# Altium schematic symbol library AD_Lib.SchLib: 1239 symbols (part 8 of 9) (continued)
## RN0603_2.2K*4
designator RN?, comment 2.2k¦¸,62.5mW
ÌùÆ¬ÅÅ×è; Manufacturer: KOA; pro-environment: RoHS; Quality: -55~125¡æ; other: 2.2k¦¸,62.5mW,5%,50V; OPN: CN1J4TTD222J; PadsNum: 0; SN: SN; Category: ÅÅ×è; Part: CN1J4TTD222J; Value: 2.2k¦¸,62.5mW; Price: ?; OPN_JLC: OPN_JLC; SN_JLC: SN_JLC; Price_JLC: 0
footprint RN0603*4
pins: 1, 2, 3, 4, 5, 6, 7, 8

## RN0603_10K*4
designator RN?, comment 10k¦¸,62.5mW
ÌùÆ¬ÅÅ×è; Manufacturer: KOA; pro-environment: RoHS; Quality: -55~125¡æ; SN: 03.4.38.13.16010301S; other: 10Kk¦¸,62.5mW,5%,50V; OPN: CN1J4TTD103J; PadsNum: 0; Category: ÅÅ×è; Part: CN1J4TTD103J; Value: 10k¦¸,62.5mW; QTY: 5000; Price: ?; OPN_JLC: OPN_JLC; SN_JLC: SN_JLC; Price_JLC: 0
footprint RN0603*4
pins: 1, 2, 3, 4, 5, 6, 7, 8

## RN0603_10K*4@2
designator RN?, comment 10k¦¸,62.5mW
ÌùÆ¬ÅÅ×è; Manufacturer: Panasonic; pro-environment: RoHS; Quality: -55~155¡æ; other: 10k¦¸,62.5mW,5%,50V; OPN: EXB-38V103JV; PadsNum: 0; SN: SN; Category: ÅÅ×è; Part: EXB-38V103JV; Value: 10k¦¸,62.5mW; Price: ?; OPN_JLC: OPN_JLC; SN_JLC: SN_JLC; Price_JLC: 0
footprint RN0603*4
pins: 1, 2, 3, 4, 5, 6, 7, 8

## RN0603_22*4
designator RN?, comment 22¦¸,62.5mW
ÌùÆ¬ÅÅ×è; Manufacturer: KOA; pro-environment: RoHS; Quality: -55~155¡æ; other: 22¦¸,62.5mW,5%,50V; OPN: CN1J4TTD220J; PadsNum: 0; SN: SN; Category: ÅÅ×è; Part: CN1J4TTD220J; Value: 22¦¸,62.5mW; Price: ?; OPN_JLC: OPN_JLC; SN_JLC: SN_JLC; Price_JLC: 0
footprint RN0603*4
pins: 1, 2, 3, 4, 5, 6, 7, 8

## RV_390KD07
designator RV?, comment 390KD07
Ñ¹Ãôµç×è; 31VDC; 39VDC; 77V; 2.1J; Manufacturer: Ì¨Íå¾ýÒ«; pro-environment: RoHS; Quality: -40~85¡æ; Value: 31VDC,77V,2.1J; other: 31VDC;39VDC;Vc=77V;250A;2.1J; PadsNum: 0; SN: SN; OPN: -; Part: 390KD07; Category: Ñ¹Ãôµç×è; QTY: 1000; Price: -; OPN_JLC: 390KD07; SN_JLC: C78335; Price_JLC: 0.191406
footprint VDR_390K (Footprint not found)
pins: 1, 2

## RV_B72210S0300K101
designator RV?, comment S10K30  (value not drawn)
Ñ¹Ãôµç×è; 30VAC; 38VDC; 93V; 4.4J; Manufacturer: EPCOS; pro-environment: RoHS; Quality: -40~85¡æ; SN: 03.4.38.16.99030001S; Value: 30VAC,93V,4.4J; OPN: B72210S0300K101; other: 30VAC;38VDC;Vc=93V;500A;4.4J; PadsNum: 0; Part: S10K30; Category: Ñ¹Ãôµç×è; QTY: 500; Price: 1.3455; OPN_JLC: OPN_JLC; SN_JLC: SN_JLC; Price_JLC: 0
footprint VDR_S10K30 (Footprint not found)
pins: 1, 2

## RV_B72214S0111K101
designator RV?, comment S14K115
Ñ¹Ãôµç×è; 125VAC; 150VDC; 300V; 30J; Manufacturer: EPCOS; pro-environment: RoHS; Quality: -40~85¡æ; Value: 125VAC,300V,30J; OPN: B72214S0111K101; other: 125VAC;150VDC;300V;4.5kA;30J; PadsNum: 0; SN: SN; Part: S14K115; Category: Ñ¹Ãôµç×è; QTY: 500; Price: 1.7667; OPN_JLC: B72214S0111K101; SN_JLC: C125531; Price_JLC: 0.92916
footprint VDR_S14K115 (EPCOS£¬Ö±²åÑ¹Ãôµç×è)
pins: 1, 2

## RV_B72214S0131K101
designator RV?, comment S14K130  (value not drawn)
Ñ¹Ãôµç×è,130VAC,170VDC,340V,34J; Manufacturer: EPCOS; pro-environment: RoHS; Quality: -40~85¡æ; SN: 03.4.38.14.99013101S; Value: 130VAC,170VDC,34J; OPN: B72214S0131K101; other: 130VAC;170VDC;Vc=340V;4.5kA;34J; PadsNum: 0; Part: S14K130; Category: Ñ¹Ãôµç×è; QTY: 500; Price: 1.7667; OPN_JLC: OPN_JLC; SN_JLC: SN_JLC; Price_JLC: 0
footprint VDR_S14K130 (Footprint not found)
pins: 1, 2

## RV_B72214S0300K101
designator RV?, comment S14K30  (value not drawn)
Ñ¹Ãôµç×è; 30VAC; 38VDC; 93V; 9J; Manufacturer: EPCOS; pro-environment: RoHS; Quality: -40~85¡æ; SN: 03.4.38.14.99030001S; Value: 30VAC,93V; OPN: B72214S0300K101; other: 30VAC;38VDC;Vc=93V;1kA;9J; PadsNum: 0; Part: S14K30; Category: Ñ¹Ãôµç×è; QTY: 500; Price: 1.7667; OPN_JLC: OPN_JLC; SN_JLC: SN_JLC; Price_JLC: 0
footprint VDR_S14K30 (EPCOS£¬Ö±²åÑ¹Ãôµç×è)
pins: 1, 2

## RV_B72214S2271K101
designator RV?, comment S14K275E2  (value not drawn)
Ñ¹Ãôµç×è,275VAC,350VDC,110J; Manufacturer: EPCOS; pro-environment: RoHS; Quality: -40~105¡æ; Value: 275VAC,350VDC,430V,110J; OPN: B72214S2271K101; other: 275VAC;350VDC;Vc=430V;1kA;110J; PadsNum: 0; SN: SN; Part: S14K275E2; Category: Ñ¹Ãôµç×è; QTY: 500; Price: 2.3166; OPN_JLC: OPN_JLC; SN_JLC: SN_JLC; Price_JLC: 0
footprint VDR_S14K275 (Footprint not found)
pins: 1, 2

## RV_ERZVF2M201
designator RV?, comment ERZVF2M201  (value not drawn)
Ñ¹Ãôµç×è,130VAC,170VDC,340V,600A,8J; Manufacturer: Panasonic; pro-environment: RoHS; Quality: -40~85¡æ; Value: 130VAC,170DCV,340V,8J; PadsNum: 0; SN: SN; OPN: ERZVF2M201; Part: ERZVF2M201; Category: Ñ¹Ãôµç×è; QTY: 2000; Price: 5.9202; OPN_JLC: OPN_JLC; SN_JLC: SN_JLC; Price_JLC: 0
footprint ZNR_VF (Footprint not found)
pins: 1, 2

## RV_V30MLA0603NHAUTO
designator RV?, comment V30MLA0603NHAUTO  (value not drawn)
Ñ¹Ãôµç×è; 25V; 74V; 0.1J; Manufacturer: Littelfuse; pro-environment: RoHS; Quality: -40~85¡æ; SN: 03.4.38.16.16V30M01S; Value: 25V,74V,0.1J; other: 25VAC;30VDC;74V;30A;0.1J; PadsNum: 0; OPN: V30MLA0603NHAUTO; Part: V30MLA0603NHAUTO; Category: Ñ¹Ãôµç×è; QTY: 2500; Price: 1.3806; OPN_JLC: OPN_JLC; SN_JLC: SN_JLC; Price_JLC: 0
footprint R0603 (ÌùÆ¬µç×è£¬¹¦ÂÊ1/10W)
pins: 1, 2

## RV_ZV35K14B1
designator RV?, comment ZV35K14  (value not drawn)
Ñ¹Ãôµç×è; Manufacturer: KEKO; pro-environment: RoHS; Quality: -40~85¡æ; Value: 35V,90V,9.2J; OPN: ZV35K14B1; other: Âò²»µ½www.keko-varicon.si; PadsNum: 0; SN: SN; Part: ZV35K14; Category: Ñ¹Ãôµç×è; QTY: 500; Price: -; OPN_JLC: OPN_JLC; SN_JLC: SN_JLC; Price_JLC: 0
footprint ZV35K14 (Footprint not found)
pins: 1, 2

## RY_ACT512
designator RY?, comment ACT512
¼ÌµçÆ÷;1 Form C x 2; Manufacturer: Panasonic; pro-environment: RoHS; Quality: -40~85¡æ; SN: 03.4.36.11.99T51201S; Value: 20A-14VDC, 12V; PadsNum: 0; OPN: ACT512; Part: ACT512; Category: ¼ÌµçÆ÷; QTY: 30; Price: 34.866; OPN_JLC: OPN_JLC; SN_JLC: SN_JLC; Price_JLC: 0
footprint RY_ACT512 (PanasonicÖ®2×é¼ÌµçÆ÷)
part A pins: 1, 2, 3
part B pins: 4 IN-, 5 IN+
part C pins: 6, 7, 8
part D pins: 9 IN-, 10 IN+

## RY_APAN3105
designator RY?, comment APAN3105
¼ÌµçÆ÷; MR; 1NC1NO; 5V/5A; Manufacturer: Panasonic; pro-environment: RoHS; Quality: -40~85¡æ; SN: 03.4.36.11.99310501S; Vaule: 5A-110VDC, 5V; PadsNum: 4; OPN: APAN3105; Part: APAN3105; Category: ¼ÌµçÆ÷; QTY: 25; Price: 45.8441; OPN_JLC: APAN3105; SN_JLC: C90227; Price_JLC: 7.12
footprint RY_APAN31 (PanasonicÖ® PA-NÏµÁÐ¼ÌµçÆ÷£¬APAN31xx)
pins: 1 +, 2 -, 5 NO, 6 COM

## RY_AQV210EH
designator RY?, comment AQV210
¼ÌµçÆ÷; SSR; 1NO;  350V; 0.13A; Manufacturer: Panasonic; pro-environment: RoHS; Quality: -40~85¡æ; Vaule: 0.13A/350V; OPN: AQV210EH; PadsNum: 0; SN: SN; Part: AQV210; Category: ¼ÌµçÆ÷; QTY: 25; Price: 30.6456; OPN_JLC: AQV210EH; SN_JLC: C1558825; Price_JLC: 17.94
footprint DIP-6 (Footprint not found)
pins: 1 A "Anode", 2 K "Cathode", 4 D "Drain", 5 S "Source", 6 D "Drain"

## RY_AQZ104
designator RY?, comment AQZ104
¼ÌµçÆ÷; SSR; 1NO;  30V; 2A; Manufacturer: Panasonic; pro-environment: RoHS; Quality: -40~85¡æ; SN: 03.4.36.19.12400001S; Vaule: 2A-30VDC, 5V; PadsNum: 0; OPN: AQZ104; Part: AQZ104; Category: ¼ÌµçÆ÷; QTY: 25; Price: 72.5985; OPN_JLC: OPN_JLC; SN_JLC: SN_JLC; Price_JLC: 0
footprint RY_AQZ104 (PanasonicÖ®¹ÌÌ¬¼ÌµçÆ÷)
pins: 1 K "Cathode", 2 A "Anode", 3 S "Source", 4 D "Drain"

## RY_DK2A-5V
designator RY?, comment DK2a-5V
¼ÌµçÆ÷,1NC1NO,5V/5A; Manufacturer: Panasonic; pro-environment: RoHS; Quality: -40~85¡æ; Vaule: 10A-250VAC, 5V; PadsNum: 0; SN: SN; OPN: DK2a-5V; Part: DK2a-5V; Category: ¼ÌµçÆ÷; QTY: 50; Price: ?; OPN_JLC: OPN_JLC; SN_JLC: SN_JLC; Price_JLC: 0
footprint RY_DK2a (PanasonicÖ®DKÏµÁÐ¼ÌµçÆ÷)
pins: 1, 3, 4, 5, 6, 8
text: +; -

## RY_F470
designator RY?, comment F470
¼ÌµçÆ÷;1 Form C x 2; Manufacturer: LEACH; pro-environment: RoHS; Quality: -40~85¡æ; SN: 03.4.36.11.99T51201S; Value: 20A-14VDC, 12V; PadsNum: 0; OPN: F470; Part: F470; Category: ¼ÌµçÆ÷; QTY: 30; Price: 34.866; OPN_JLC: OPN_JLC; SN_JLC: SN_JLC; Price_JLC: 0
footprint RY_SF400 (LEACH·¨¹úÁ¦ÆæF470¼ÌµçÆ÷µ××ù)
part A pins: A2, D2
part B pins: D1, D3, D4
part C pins: C1, C3, C4
part D pins: B1, B3, B4
part E pins: A1, A3, A4
part A text: X1; X2

## RY_FTR-LYCA 005V
designator RY?, comment FTR-LYCA 005V
¼ÌµçÆ÷; MR; 1NC1NO; 5V/144W; Manufacturer: Fujitsu; pro-environment: RoHS; Quality: -40~85¡æ; Value: 6A-24VDC, 5V; PadsNum: 0; SN: SN; OPN: FTR-LYCA 005V; Part: FTR-LYCA 005V; Category: ¼ÌµçÆ÷; QTY: 50; Price: ?; OPN_JLC: OPN_JLC; SN_JLC: SN_JLC; Price_JLC: 0
footprint V23079_THT (¼ÌµçÆ÷V23079Ö±²åÏµÁÐ£¬ÈçV23079-A1005-B301)
pins: 1, 2, 3, 4, 5
text: +; -

## RY_G5NB-1A-E-DC5V@1
designator RY?, comment G5NB
¼ÌµçÆ÷; MR; 1NO; 5V/90W; Manufacturer: OMRON; pro-environment: RoHS; Quality: -40~85¡æ; Value: 5V/3A; OPN: G5NB-1A-E-DC5V; PadsNum: 4; SN: SN; Part: G5NB; Category: ¼ÌµçÆ÷; QTY: 50; Price: -; OPN_JLC: G5NB-1A-E-DC5V; SN_JLC: C48746; Price_JLC: 2.25
footprint RY_G5NB (Å·Ä·ÁúÖ®G5NBÏµÁÐ¼ÌµçÆ÷£¬ÈçG5NB-1A-E-DC5V)
part A pins: 1, 4
part B pins: 2, 3

## RY_HF32F-G/005-HS@1
designator RY?, comment HF32F-G
¼ÌµçÆ÷; MR; 1NO; 5V/300W; Manufacturer: ºê·¢; pro-environment: RoHS; Quality: -40~85¡æ; Value: 5V/10A; OPN: HF32F-G/005-HS; PadsNum: 4; SN: SN; Part: HF32F-G; Category: ¼ÌµçÆ÷; QTY: 100; Price: -; OPN_JLC: HF32F-G/005-HS; SN_JLC: C74541; Price_JLC: 2.97
footprint RY_HF32F-G (ºê·¢Ö®HF32F-GÏµÁÐ¼ÌµçÆ÷£¬ÈçHF32F-G/012-HS)
part A pins: 1, 4
part B pins: 2, 3

## RY_HF49FD/005-1H11@1
designator RY?, comment HF49FD
¼ÌµçÆ÷; MR; 1NO; 5V/150W; Manufacturer: ºê·¢; pro-environment: RoHS; Quality: -40~85¡æ; Value: 5V, 150W; OPN: HF49FD/005-1H11; PadsNum: 4; SN: SN; Part: HF49FD; Category: ¼ÌµçÆ÷; QTY: 50; Price: 4.13; OPN_JLC: HF49FD/005-1H11; SN_JLC: C28975; Price_JLC: 4
footprint RY_HF49FD (ºê·¢Ö®HF49FDÏµÁÐ¼ÌµçÆ÷£¬ÈçHF49FD/005-1H11)
part A pins: 1, 2
part B pins: 3, 4

## RY_HF115F/005-2ZS4@1
designator RY?, comment HF115F
¼ÌµçÆ÷; MR; 2NC2NO; 5V/16A; Manufacturer: ºê·¢; pro-environment: RoHS; Quality: -40~85¡æ; OPN: HF115F/005-2ZS4; PadsNum: 8; SN: SN; Vaule: 5V/16A; Part: HF115F; Category: ¼ÌµçÆ÷; QTY: 50; Price: -; OPN_JLC: HF115F/005-2ZS4; SN_JLC: C9226; Price_JLC: 6.76
footprint RY_HF115F (ºê·¢Ö®HF115FÏµÁÐ¼ÌµçÆ÷£¬ÈçHF115F-024-2ZS4)
part A pins: 1 IN+, 2
part B pins: 3, 4, 5
part C pins: 6, 7, 8

## RY_IM03GR
designator RY?, comment IM03GR
¼ÌµçÆ÷; MR; 2NC2NO; 5V/2A; Manufacturer: TE Connectivity; pro-environment: RoHS; Quality: -40~85¡æ; PadsNum: 0; SN: SN; Vaule: 5V/2A; OPN: IM03GR; Part: IM03GR; Category: ¼ÌµçÆ÷; QTY: 1000; Price: 15.8878; OPN_JLC: OPN_JLC; SN_JLC: SN_JLC; Price_JLC: 0
footprint RY_IM_G (IMÏµÁÐ¼ÌµçÆ÷£¬Gull Wings·â×°¡£ÈçIM03GR)
pins: 1, 2, 3, 4, 5, 6, 7, 8
text: +; -

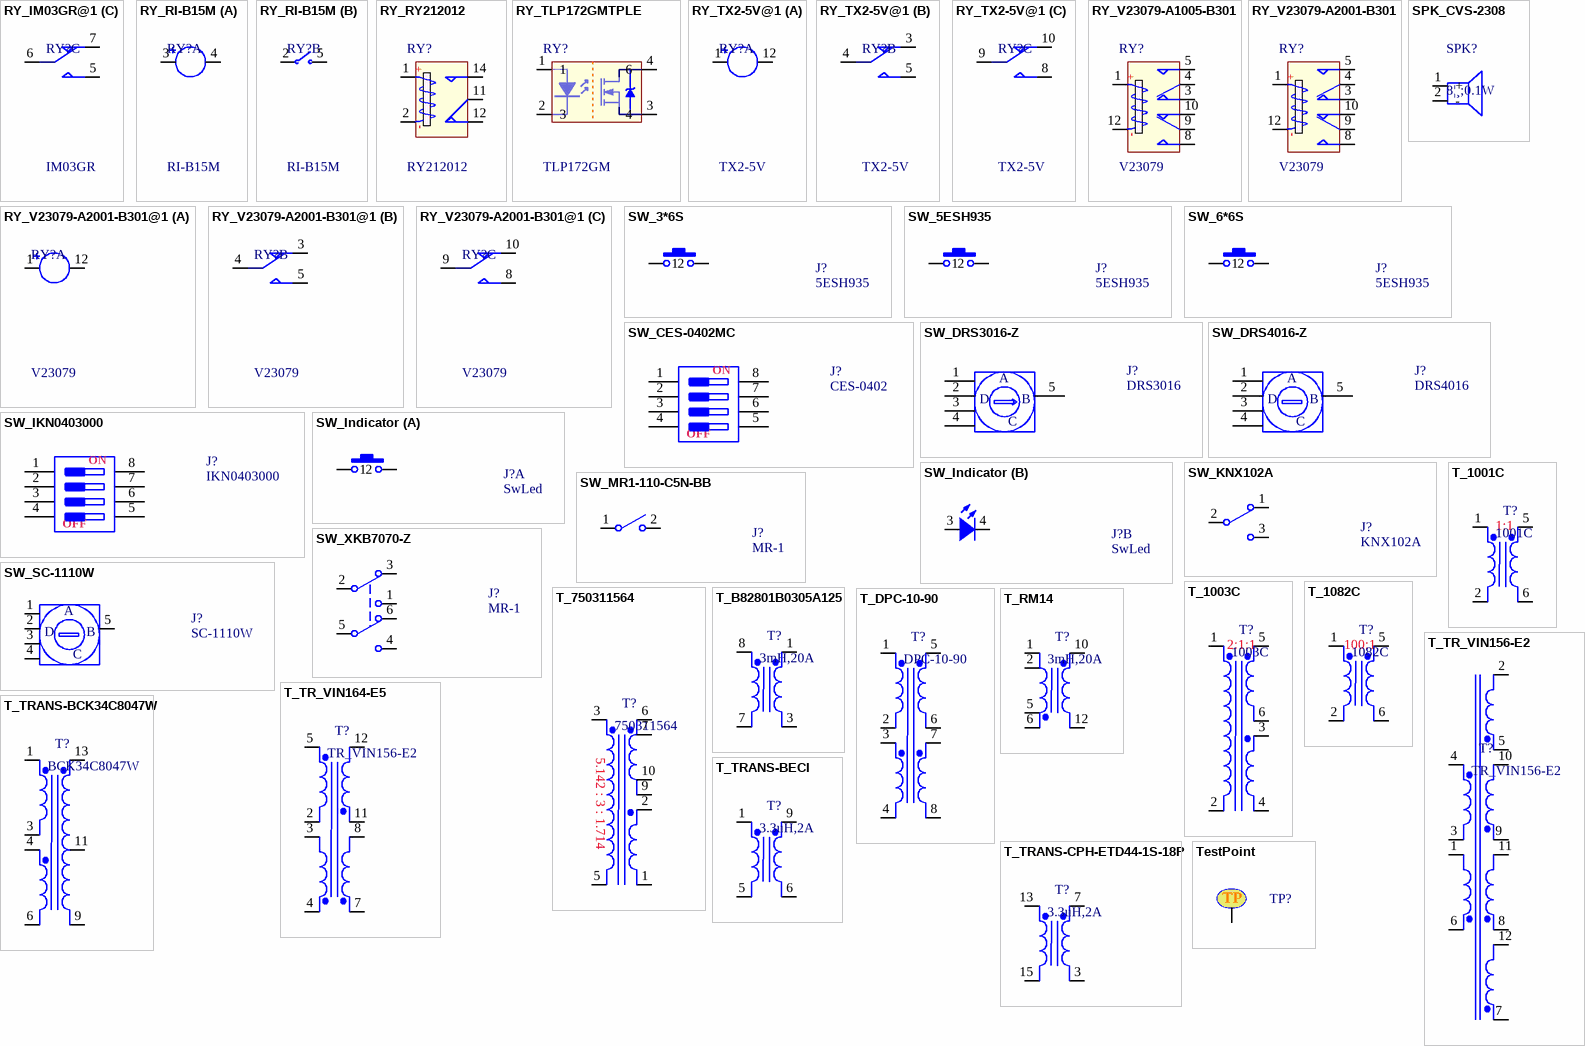
[diagram p38: symbols RY_IM03GR@1 to TestPoint]

## RY_IM03GR@1
designator RY?, comment IM03GR
¼ÌµçÆ÷; MR; 2NC2NO; 5V/2A; Manufacturer: TE Connectivity; pro-environment: RoHS; Quality: -40~85¡æ; PadsNum: 0; SN: SN; Vaule: 5V/2A; OPN: IM03GR; Part: IM03GR; Category: ¼ÌµçÆ÷; QTY: 1000; Price: 15.8878; OPN_JLC: OPN_JLC; SN_JLC: SN_JLC; Price_JLC: 0
footprint RY_IM_G (IMÏµÁÐ¼ÌµçÆ÷£¬Gull Wings·â×°¡£ÈçIM03GR)
part A pins: 1 IN+, 8 IN-
part B pins: 2, 3, 4
part C pins: 5, 6, 7

## RY_RI-B15M
designator RY?, comment RI-B15M
¼ÌµçÆ÷; 2NC2NO; Manufacturer: YASKAWA; pro-environment: RoHS; Quality: -40~85¡æ; SN: 03.4.36.11.99B15M01S; Value: 2A-30VDC, 24V; PadsNum: 0; OPN: RI-B15M; Part: RI-B15M; Category: ¼ÌµçÆ÷; Price: ?; OPN_JLC: OPN_JLC; SN_JLC: SN_JLC; Price_JLC: 0
footprint RI-B15M (°²´¨¼ÌµçÆ÷)
part A pins: 3 IN+, 4 IN-
part B pins: 2 OUT+, 5 OUT-

## RY_RY212012
designator RY?, comment RY212012
¼ÌµçÆ÷; MR; 1NC1NO; 12V/8A; Manufacturer: TE Connectivity; pro-environment: RoHS; Quality: -40~85¡æ; Value: 8A-250VAC, 12V; PadsNum: 0; SN: SN; OPN: RY212012; Part: RY212012; Category: ¼ÌµçÆ÷; QTY: 20; Price: 40.7252; OPN_JLC: OPN_JLC; SN_JLC: SN_JLC; Price_JLC: 0
footprint RY_RY212 (¼ÌµçÆ÷RY212Ö±²åÏµÁÐ£¬ÈçRY212012)
pins: 1, 2, 11, 12, 14
text: +; -

## RY_TLP172GMTPLE
designator RY?, comment TLP172GM
¼ÌµçÆ÷; SSR; 1NO;  280V; 0.11A; Manufacturer: Toshiba; pro-environment: RoHS; Quality: -20~100¡æ; Vaule: 280V, 0.11A; OPN: TLP172GMTPLE; PadsNum: 4; SN: SN; Part: TLP172GM; Category: ¼ÌµçÆ÷; QTY: 3000; Price: 10.6559; OPN_JLC: TLP172GMTPLE; SN_JLC: C261926; Price_JLC: 3.63
footprint SO-4W (Pitch=100mil£¬ÈçHCPL-181)
pins: 1 "Anode", 2 3 "Cathode", 3 4 "Source", 4 6 "Drain"

## RY_TX2-5V@1
designator RY?, comment TX2-5V
¼ÌµçÆ÷; DPDT; 5V/60W; Manufacturer: Panasonic; pro-environment: RoHS; Quality: -40~85¡æ; Value: 5V,60W; PadsNum: 8; SN: SN; OPN: TX2-5V; Part: TX2-5V; Category: ¼ÌµçÆ÷; QTY: 50; Price: 21.922; OPN_JLC: TX2-5V; SN_JLC: C192257; Price_JLC: 5.48
footprint RY_TX2 (PanasonicÖ®TX2ÏµÁÐ£¬ÈçTX2-5V)
part A pins: 1, 12
part B pins: 3, 4, 5
part C pins: 8, 9, 10

## RY_V23079-A1005-B301
designator RY?, comment V23079
¼ÌµçÆ÷,2NC2NO,24V/60W; Manufacturer: TE Connectivity; pro-environment: RoHS; Quality: -40~85¡æ; Value: 2A-30VDC, 24V; OPN: V23079-A1005-B301; PadsNum: 0; SN: SN; Part: V23079; Category: ¼ÌµçÆ÷; QTY: 40; Price: ?; OPN_JLC: OPN_JLC; SN_JLC: SN_JLC; Price_JLC: 0
footprint RY_V23079_THT (¼ÌµçÆ÷V23079Ö±²åÏµÁÐ£¬ÈçV23079-A1005-B301)
pins: 1, 3, 4, 5, 8, 9, 10, 12
text: +; -

## RY_V23079-A2001-B301
designator RY?, comment V23079
¼ÌµçÆ÷,2NC2NO,5V/60W; Manufacturer: TE Connectivity; pro-environment: RoHS; Quality: -40~85¡æ; Value: 2A-30VDC, 5V; OPN: V23079-A2001-B301; PadsNum: 0; SN: SN; Part: V23079; Category: ¼ÌµçÆ÷; QTY: 50; Price: ?; OPN_JLC: OPN_JLC; SN_JLC: SN_JLC; Price_JLC: 0
footprint RY_V23079_THT (¼ÌµçÆ÷V23079Ö±²åÏµÁÐ£¬ÈçV23079-A1005-B301)
pins: 1, 3, 4, 5, 8, 9, 10, 12
text: +; -

## RY_V23079-A2001-B301@1
designator RY?, comment V23079
¼ÌµçÆ÷,2NC2NO,5V/60W; Manufacturer: TE Connectivity; pro-environment: RoHS; Quality: -40~85¡æ; Value: 2A-30VDC, 5V; OPN: V23079-A2001-B301; PadsNum: 0; SN: SN; Part: V23079; Category: ¼ÌµçÆ÷; QTY: 50; Price: ?; OPN_JLC: OPN_JLC; SN_JLC: SN_JLC; Price_JLC: 0
footprint RY_V23079_THT (¼ÌµçÆ÷V23079Ö±²åÏµÁÐ£¬ÈçV23079-A1005-B301)
part A pins: 1, 12
part B pins: 3, 4, 5
part C pins: 8, 9, 10

## SPK_CVS-2308
designator SPK?, comment 8¦¸;0.1W
°åÔØÑïÉùÆ÷;8¦¸;0.5W; Manufacturer: CUI; Part: 2308; pro-environment: RoHS; Quality: -20~55¡æ; other: 8¦¸;0.1W;88dB;1.5kHz; PadsNum: 0; SN: -; Category: µçÈÝ; OPN: CVS-2308; Value: 8¦¸;0.1W; QTY: 1000; Price: 13.1625; OPN_JLC: OPN_JLC; SN_JLC: SN_JLC; Price_JLC: 0
footprint CVS-2308 (Ö±²åÑïÉùÆ÷)
pins: 1 +, 2 -

## SW_3*6S
designator J?, comment 5ESH935
°´¼ü; SPST; Manufacturer: Apem; Value: 24VDC;50mA; pro-environment: RoHS; SN: 03.4.42.14.995ESH02S; Quality: -25~75¡ãC; other: SPST;24VDC;50mA; PadsNum: 2; Category: ¿ª¹Ø; OPN: 5ESH935; Part: 5ESH935; QTY: 1000; Price: -; OPN_JLC: K2-1107ST-A4DW-06; SN_JLC: C118141; Price_JLC: 0.250993
footprint SW_3*6S (°´¼ü£¬3*6£¬ÌùÆ¬)
pins: 1, 2

## SW_5ESH935
designator J?, comment 5ESH935
°´¼ü£¬SPST; Manufacturer: Apem; Value: 24VDC;50mA; pro-environment: RoHS; SN: 03.4.42.14.995ESH02S; Quality: -25~75¡ãC; other: SPST;24VDC;50mA; PadsNum: 0; Category: ¿ª¹Ø; OPN: 5ESH935; Part: 5ESH935; QTY: 50; Price: ?; OPN_JLC: OPN_JLC; SN_JLC: SN_JLC; Price_JLC: 0
footprint SW_5ESH935 (SPST°´¼ü)
pins: 1, 2

## SW_6*6S
designator J?, comment 5ESH935
°´¼ü£¬SPST; Manufacturer: Apem; Value: 24VDC;50mA; pro-environment: RoHS; SN: 03.4.42.14.995ESH02S; Quality: -25~75¡ãC; other: SPST;24VDC;50mA; PadsNum: 0; Category: ¿ª¹Ø; OPN: 5ESH935; Part: 5ESH935; QTY: 50; Price: ?; OPN_JLC: OPN_JLC; SN_JLC: SN_JLC; Price_JLC: 0
footprint SW1_6*6P (°´¼ü£¬6*6£¬Ö±²å)
pins: 1, 2

## SW_CES-0402MC
designator J?, comment CES-0402
²¦Âë¿ª¹Ø,4bit; Manufacturer: Copal; Value: 50V,100mA; pro-environment: RoHS; SN: 03.4.42.14.11CESC01S; OPN: CES-0402MC; Quality: -40~85¡ãC; other: ²¦Âë¿ª¹Ø;4bit; PadsNum: 0; Category: ¿ª¹Ø; Part: CES-0402; QTY: 36; Price: ?; OPN_JLC: OPN_JLC; SN_JLC: SN_JLC; Price_JLC: 0
footprint CES-0804C (DIP; 8 Leads; Row Spacing 7.62 mm; Pitch 2.54 mm)
pins: 1 A1, 2 A2, 3 A3, 4 A4, 5 B4, 6 B3, 7 B2, 8 B1
text: ON; OFF

## SW_DRS3016-Z
designator J?, comment DRS3016
ÐýÅ¥±àÂëÆ÷£¬4bit£¬16½øÖÆ; Manufacturer: ¸»Ê¿²â; Value: 50V£¬100mA; pro-environment: RoHS; OPN: DRS3016-Z; Quality: -25~75¡ãC; other: ÐýÅ¥Ã±£º»ÆKR108£»ºìKR109£»°×KR110; PadsNum: 0; SN: SN; Category: ¿ª¹Ø; Part: DRS3016; Price: ?; OPN_JLC: OPN_JLC; SN_JLC: SN_JLC; Price_JLC: 0
footprint DRS3016 (Ðý×ª±àÂëÆ÷£¬ÎÞÐý¸Ë)
pins: 1, 2, 3, 4, 5
text: A; D; B; C

## SW_DRS4016-Z
designator J?, comment DRS4016
ÐýÅ¥±àÂëÆ÷£¬4bit£¬16½øÖÆ; Manufacturer: ¸»Ê¿²â; Value: 50V£¬100mA; pro-environment: RoHS; OPN: DRS4016-Z; Quality: -25~75¡ãC; other: ÐýÅ¥Ã±£º»ÆKR108£»ºìKR109£»°×KR110; PadsNum: 0; SN: SN; Category: ¿ª¹Ø; Part: DRS4016; Price: ?; OPN_JLC: OPN_JLC; SN_JLC: SN_JLC; Price_JLC: 0
footprint DRS4016 (Ðý×ª±àÂëÆ÷£¬ÓÐÐý¸Ë)
pins: 1, 2, 3, 4, 5
text: A; D; B; C

## SW_IKN0403000
designator J?, comment IKN0403000
²¦Âë¿ª¹Ø,4bit; Manufacturer: Apem; Value: 24V,100mA; pro-environment: RoHS; SN: 03.4.42.13.11040301S; Quality: -40~100¡ãC; other: ²¦Âë¿ª¹Ø;4bit; PadsNum: 0; Category: ¿ª¹Ø; OPN: IKN0403000; Part: IKN0403000; QTY: 48; Price: ?; OPN_JLC: OPN_JLC; SN_JLC: SN_JLC; Price_JLC: 0
footprint IKN0403 (ApemÖ®IKNÏµÁÐ²¥Âë¿ª¹Ø£¬4bit)
pins: 1 A1, 2 A2, 3 A3, 4 A4, 5 B4, 6 B3, 7 B2, 8 B1
text: ON; OFF

## SW_Indicator
designator J?, comment SwLed
°´¼ü; ¿ª¿×16mm; ×ÔËø/×Ô¸´; 3~220V; Manufacturer: Lanboo; Value: 3~220VDC;; pro-environment: RoHS; OPN: ½ðÊô°´Å¥¿ª¹Ø´øµÆ; Quality: -25~75¡ãC; other: 16mm½ðÊô°´Å¥¿ª¹Ø´øµÆ¸´Î»×ÔËø; PadsNum: 0; SN: SN; Category: ¿ª¹Ø; Part: SwLed; QTY: 1; Price: 14.5; OPN_JLC: OPN_JLC; SN_JLC: SN_JLC; Price_JLC: 0
part A pins: 1, 2
part B pins: 3, 4

## SW_KNX102A
designator J?, comment KNX102A
¿ª¹Ø,SPDT,250VAC,5A; Manufacturer: Apem; pro-environment: RoHS; Quality: -25~85¡ãC; other: SPDT;250VAC;5A; PadsNum: 0; Value: 250VAC,5A; SN: SN; Category: ¿ª¹Ø; OPN: KNX102A; Part: KNX102A; QTY: 50; Price: ?; OPN_JLC: OPN_JLC; SN_JLC: SN_JLC; Price_JLC: 0
footprint SW_SPDT (µ¥µ¶Ë«ÖÀ¿ª¹Ø£¬Òý½Å¼ä¾à4.7mm£»KNX102A)
pins: 1, 2, 3

## SW_MR1-110-C5N-BB
designator J?, comment MR-1
¿ª¹Ø; SPST; 6A/250VAC; Manufacturer: ºê¾Û; Value: 250VAC,6A; pro-environment: RoHS; OPN: MR1-110-C5N-BB; Quality: 0~85¡ãC; other: SPST, 250VAC, 6A; PadsNum: 0; SN: SN; Category: ¿ª¹Ø; Part: MR-1; QTY: 50; Price: ?; OPN_JLC: MR1-110-C5N-BB; SN_JLC: C268222; Price_JLC: 0.922
footprint SW_MR-1 (Footprint not found)
pins: 1, 2

## SW_SC-1110W
designator J?, comment SC-1110W
ÐýÅ¥±àÂëÆ÷£¬4bit£¬16½øÖÆ£¬·Ç²¹Âë; Manufacturer: COPAL; Value: 5V,100mA; pro-environment: RoHS; Quality: -25~85¡ãC; other: ÐýÅ¥£º»ÆÉ«; PadsNum: 0; SN: SN; Category: ¿ª¹Ø; OPN: SC-1110W; Part: SC-1110W; QTY: 50; Price: ?; OPN_JLC: OPN_JLC; SN_JLC: SN_JLC; Price_JLC: 0
footprint SC1110W (Ðý×ª±àÂëÆ÷£¬ÓÐÐý¸Ë)
pins: 1, 2, 3, 4, 5
text: A; D; B; C

## SW_XKB7070-Z
designator J?, comment MR-1
¿ª¹Ø; DSDT; 30V; 0.1A; Manufacturer: XKB; Value: 30V,0.1A; pro-environment: RoHS; OPN: XKB7070-Z; Quality: 0~85¡ãC; other: SPST, 250VAC, 6A; PadsNum: 0; SN: SN; Category: ¿ª¹Ø; Part: MR-1; QTY: 50; Price: -; OPN_JLC: XKB7070-Z; SN_JLC: C318863; Price_JLC: 0.5999
footprint SW_XKB7070-Z (XKBÖ®7*7mm ×ÔËø¿ª¹Ø£¬Áù½Å)
pins: 1, 2, 3, 4, 5, 6

## T_1001C
designator T?, comment 1001C
±äÑ¹Æ÷£¬1:1; Manufacturer: Murata; Quality: 0~70¡æ; pro-environment: RoHS; other: Lp=3.0mH;Rp=1.2;Rs=1.0;Viso=2kV; Value: 1:1;200 Vus; PadsNum: 0; SN: SN; OPN: 1001C; Part: 1001C; Category: µç¸Ð; QTY: 30; Price: ?; OPN_JLC: OPN_JLC; SN_JLC: SN_JLC; Price_JLC: 0
footprint T_1000A (Footprint not found)
pins: 1, 2, 5, 6
text: 1:1

## T_1003C
designator T?, comment 1003C
±äÑ¹Æ÷£¬1:1; Manufacturer: Murata; Quality: 0~70¡æ; pro-environment: RoHS; other: Lp=12mH;Rp=4;Rs=1.8,2.4;Viso=2kV; Value: 2:1:1;400 Vus; PadsNum: 0; SN: SN; OPN: 1003C; Part: 1003C; Category: µç¸Ð; QTY: 30; Price: ?; OPN_JLC: OPN_JLC; SN_JLC: SN_JLC; Price_JLC: 0
footprint T_1000B (MurataÂö³å±äÑ¹Æ÷£¬1000ÏµÁÐ)
pins: 1, 2, 3, 4, 5, 6
text: 2:1:1

## T_1082C
designator T?, comment 1082C
±äÑ¹Æ÷£¬1:1; Manufacturer: Murata; Quality: 0~70¡æ; pro-environment: RoHS; other: Lp=6.1mH;Rp=0.7;Rs=0.1;Viso=2kV; Value: 100:1;280 Vus; PadsNum: 0; SN: SN; OPN: 1082C; Part: 1082C; Category: µç¸Ð; QTY: 30; Price: ?; OPN_JLC: OPN_JLC; SN_JLC: SN_JLC; Price_JLC: 0
footprint T_1000A (Footprint not found)
pins: 1, 2, 5, 6
text: 100:1

## T_750311564
designator T?, comment 750311564
±äÑ¹Æ÷; Manufacturer: Wurth; Quality: -40~125¡æ; SN: 03.4.32.14.99156401S; pro-environment: RoHS; other: ³õ¼¶2ÈÆ×é£¬´Î¼¶1ÈÆ×é; Value: 1.714:1 & 3:1; PadsNum: 0; OPN: 750311564; Part: 750311564; Category: ±äÑ¹Æ÷; QTY: 200; Price: 57.213; OPN_JLC: OPN_JLC; SN_JLC: SN_JLC; Price_JLC: 0
footprint 750311564 (WurthÖ®ÒôÆµ±äÑ¹Æ÷)
pins: 1, 2, 3, 5, 6, 7, 9, 10
text: 5.142 : 3 : 1.714

## T_B82801B0305A125
designator T?, comment 3mH,20A
µçÁ÷»¥¸ÐÆ÷; 1:125; Manufacturer: TDK; Quality: -25~85¡æ; pro-environment: RoHS; other: 1:125,20A,6.5¦¸,50k~1MHz,62.5 V us; OPN: B82801B0305A125; PadsNum: 0; SN: SN; Part: B82801B0305A125; Category: µç¸Ð; Value: 3mH,20A; QTY: 900; Price: 11.3607; OPN_JLC: OPN_JLC; SN_JLC: SN_JLC; Price_JLC: 0
footprint B82801B (Footprint not found)
pins: 1, 3, 7, 8

## T_DPC-10-90
designator T?, comment DPC-10-90
±äÑ¹Æ÷; 1VA, 115/230V, 10VCT, 5V 10VCT @  90mA; Manufacturer: Signal Transformer; Quality: -25~85¡æ; pro-environment: RoHS; other: ³õ¼¶2ÈÆ×é£¬´Î¼¶2ÈÆ×é; Value: (17+17) : (56+29); PadsNum: 0; SN: SN; OPN: DPC-10-90; Part: DPC-10-90; Category: µç¸Ð; QTY: 1; Price: ?; OPN_JLC: OPN_JLC; SN_JLC: SN_JLC; Price_JLC: 0
footprint TR_VIN156-E2 (Footprint not found)
pins: 1, 2, 3, 4, 5, 6, 7, 8

## T_RM14
designator T?, comment 3mH,20A
µçÁ÷»¥¸ÐÆ÷; 1:125; Manufacturer: TDK; Quality: -25~85¡æ; pro-environment: RoHS; other: 1:125,20A,6.5¦¸,50k~1MHz,62.5 V us; OPN: RM14; PadsNum: 0; SN: SN; Part: RM14; Category: µç¸Ð; Value: 3mH,20A; QTY: 900; Price: 11.3607; OPN_JLC: OPN_JLC; SN_JLC: SN_JLC; Price_JLC: 0
footprint B82801B (Footprint not found)
pins: 1, 2, 5, 6, 10, 12

## T_TR_VIN156-E2
designator T?, comment TR_VIN156-E2
±äÑ¹Æ÷; ¶©ÖÆ; Manufacturer: POLL; Quality: -25~85¡æ; pro-environment: RoHS; other: ³õ¼¶2ÈÆ×é£¬´Î¼¶2ÈÆ×é; Value: (17+17) : (56+29); PadsNum: 0; SN: SN; OPN: TR_VIN156-E2; Part: TR_VIN156-E2; Category: µç¸Ð; QTY: 1; Price: ?; OPN_JLC: OPN_JLC; SN_JLC: SN_JLC; Price_JLC: 0
footprint TR_VIN164-E5 (Footprint not found)
pins: 1, 2, 3, 4, 5, 6, 7, 8, 9, 10, 11, 12

## T_TR_VIN164-E5
designator T?, comment TR_VIN156-E2
±äÑ¹Æ÷; ¶©ÖÆ; Manufacturer: POLL; Quality: -25~85¡æ; pro-environment: RoHS; other: ³õ¼¶2ÈÆ×é£¬´Î¼¶2ÈÆ×é; Value: (17+17) : (56+29); PadsNum: 0; SN: SN; OPN: TR_VIN156-E2; Part: TR_VIN156-E2; Category: µç¸Ð; QTY: 1; Price: ?; OPN_JLC: OPN_JLC; SN_JLC: SN_JLC; Price_JLC: 0
footprint TR_VIN156-E2 (Footprint not found)
pins: 2, 3, 4, 5, 7, 8, 11, 12

## T_TRANS-BCK34C8047W
designator T?, comment BCK34C8047W
±äÑ¹Æ÷; Manufacturer: ²©¶à; Quality: -25~85¡æ; pro-environment: RoHS; other: ³õ¼¶2ÈÆ×é£¬´Î¼¶2ÈÆ×é; Value: (17+17) : (56+29); PadsNum: 0; SN: SN; OPN: BCK34C8047W; Part: BCK34C8047W; Category: µç¸Ð; QTY: 1; Price: ?; OPN_JLC: OPN_JLC; SN_JLC: SN_JLC; Price_JLC: 0
footprint BCK34C8047W (Footprint not found)
pins: 1, 3, 4, 6, 9, 11, 13

## T_TRANS-BECI
designator T?, comment 3.3uH,2A
±äÑ¹Æ÷; Part: ZJYS51R5-2PT-01; Quality: -25~85¡æ; pro-environment: RoHS; other: 2A,60m¦¸; OPN: BECI; PadsNum: 0; Manufacturer: -; SN: SN; Category: µç¸Ð; Value: 3.3uH,2A; QTY: 1500; Price: ?; OPN_JLC: OPN_JLC; SN_JLC: SN_JLC; Price_JLC: 0
footprint TR_BECI (µçÁÆÒÇÓÃÔ­ÐÍ»ú±äÑ¹Æ÷)
pins: 1, 5, 6, 9

## T_TRANS-CPH-ETD44-1S-18P
designator T?, comment 3.3uH,2A
±äÑ¹Æ÷; Manufacturer: TDK; Quality: -25~85¡æ; pro-environment: RoHS; other: 2A,60m¦¸; OPN: ZJYS51R5-2PT-01; PadsNum: 0; SN: SN; Part: ZJYS51R5-2PT-01; Category: µç¸Ð; Value: 3.3uH,2A; QTY: 1500; Price: ?; OPN_JLC: OPN_JLC; SN_JLC: SN_JLC; Price_JLC: 0
footprint TRANS-CPH-ETD44-1S-18P
pins: 3, 7, 13, 15

## TestPoint
designator TP?, comment T  (value not drawn)
²âÊÔµã; Manufacturer: NJHT; PadsNum: 0; Category: ²âÊÔµã; pro-environment: -; Quality: -; SN: -; OPN: -; Part: -; Value: -; Price: ?; OPN_JLC: OPN_JLC; SN_JLC: SN_JLC; Price_JLC: 0
footprint TestPoint2 (²âÊÔµã2)
footprint Testpoint1 (²âÊÔµã1)
pins: 0 TP

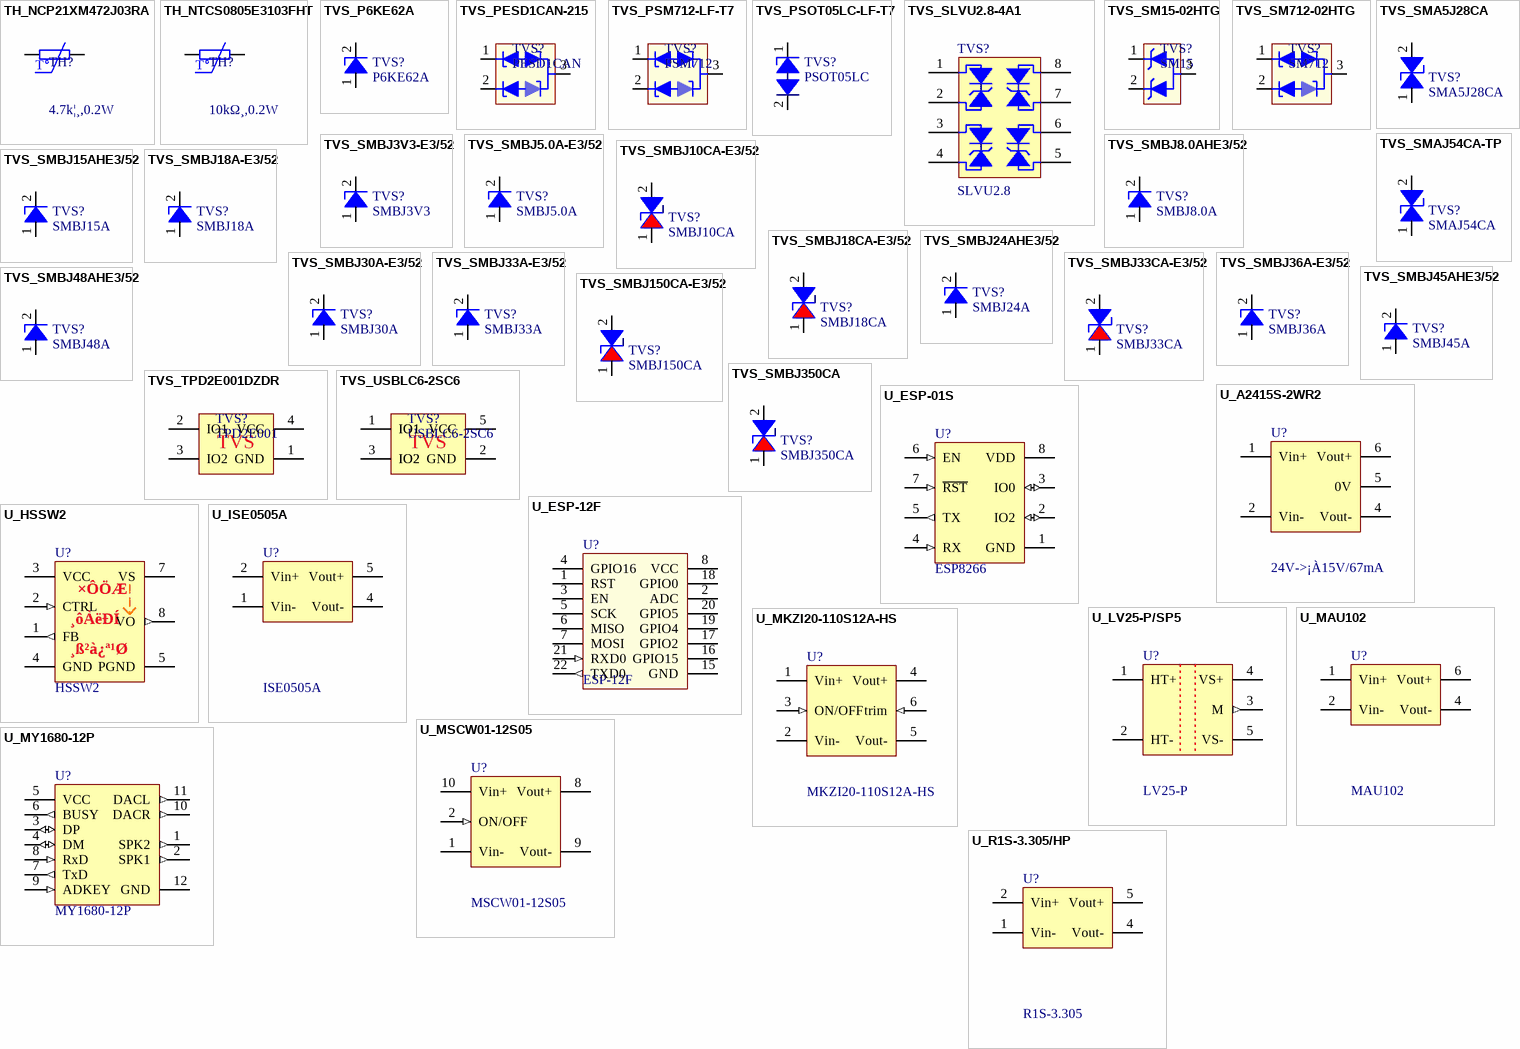
[diagram p39: symbols TH_NCP21XM472J03RA to U_R1S-3.305/HP]

## TH_NCP21XM472J03RA
designator TH?, comment 4.7k¦¸,0.2W
NTCÈÈÃôµç×è; Manufacturer: Murata; Quality: -40¡æ~125¡æ; pro-environment: RoHS; SN: 03.4.38.14.17047201S; OPN: NCP21XM472J03RA; PadsNum: 0; Other: NTCÈÈÃôµç×è; Value: 4.7k¦¸,0.2W; QTY: 4000; part: NCP21XM472J03RA; Price: ?; OPN_JLC: 0805W8F4701T5E; SN_JLC: C17673; Price_JLC: 0
footprint R0805 (ÌùÆ¬µç×è£¬¹¦ÂÊ1/8W)
pins: 1, 2
text: T

## TH_NTCS0805E3103FHT
designator TH?, comment 10kΩ¸,0.2W
NTC-Thermistor NTC 10Kohms 1%, 0805 Package; Manufacturer: Vishay; Quality: -40°C~150°C; pro-environment: RoHS; OPN: NTCS0805E3103FHT; PadsNum: 0; Other: NTC 10Kohms 1%; Value: 10kΩ¸,0.2W; part: NTCS0805E3103FHT; Price: ?; Price_JLC: 0
footprint R0805 (ÌùÆ¬µç×è£¬¹¦ÂÊ1/8W)
pins: 1, 2
text: T

## TVS_P6KE62A
designator TVS?, comment P6KE62A
TVS¹Ü; Manufacturer: ON; Quality: -65~175¡æ; pro-environment: RoHS; Value: 58.9~65.1V,85V,600W; SN: 03.4.21.24.99BJ5A02S; other: 5%; PadsNum: 0; OPN: P6KE62A; Part: P6KE62A; Category: TVS¹Ü; QTY: 4000; Price: 1.03428; OPN_JLC: OPN_JLC; SN_JLC: SN_JLC; Price_JLC: 0
footprint DO-15 (Footprint not found)
pins: 1 "A", 2 "K"

## TVS_PESD1CAN-215
designator TVS?, comment PESD1CAN
TVS¹Ü£¬CAN½Ó¿Ú×¨ÓÃ; Manufacturer: NXP; Quality: -65~125¡æ; pro-environment: RoHS; Value: 24V,200W; SN: 03.4.21.24.48PESD01S; OPN: PESD1CAN-215; PadsNum: 0; Part: PESD1CAN; Category: TVS¹Ü; QTY: 3000; Price: ?; OPN_JLC: OPN_JLC; SN_JLC: SN_JLC; Price_JLC: 0
footprint SOT23-3 (SOT-23; 3 Leads; Body 3.0 x 2.5 mm, inc. leads (LxW max))
pins: 1, 2, 3

## TVS_PSM712-LF-T7
designator TVS?, comment PSM712
TVS¹Ü£¬RS485½Ó¿Ú×¨ÓÃ; Manufacturer: Protek; Quality: -40~125¡æ; pro-environment: RoHS; Value: -7V~12V,600W; SN: 03.4.21.24.48M71201S; OPN: PSM712-LF-T7; PadsNum: 0; Part: PSM712; Category: TVS¹Ü; QTY: 3000; Price: ?; OPN_JLC: OPN_JLC; SN_JLC: SN_JLC; Price_JLC: 0
footprint SOT23-3 (SOT-23; 3 Leads; Body 3.0 x 2.5 mm, inc. leads (LxW max))
pins: 1, 2, 3

## TVS_PSOT05LC-LF-T7
designator TVS?, comment PSOT05LC
TVS¹Ü,5V; Manufacturer: Protek devices; Quality: -55~150¡æ; pro-environment: RoHS; Value: 5V,500W; SN: 03.4.21.24.48PSOT01S; OPN: PSOT05LC-LF-T7; PadsNum: 0; Part: PSOT05LC; Category: TVS¹Ü; QTY: 3000; Price: ?; OPN_JLC: OPN_JLC; SN_JLC: SN_JLC; Price_JLC: 0
footprint SOT23-3 (SOT-23; 3 Leads; Body 3.0 x 2.5 mm, inc. leads (LxW max))
pins: 1 "A", 2 "K"

## TVS_SLVU2.8-4A1
designator TVS?, comment SLVU2.8
TVS¹Ü£¬ÒÔÌ«Íø½Ó¿Ú×¨ÓÃ; Manufacturer: ST; pro-environment: RoHS; Quality: -55~80¡æ; SN: 03.4.11.99.83SLVU01S; OPN: SLVU2.8-4A1; Value: 2.8V,15V,600W; PadsNum: 0; Part: SLVU2.8; Category: TVS¹Ü; QTY: 2500; Price: ?; OPN_JLC: OPN_JLC; SN_JLC: SN_JLC; Price_JLC: 0
footprint SO-8 (SOIC, 8-Leads, Body 4.9x3.9mm, Pitch 1.27mm, IPC Low Density)
pins: 1, 2, 3, 4, 5, 6, 7, 8

## TVS_SM15-02HTG
designator TVS?, comment SM15
TVS¹Ü£¬RS232½Ó¿Ú×¨ÓÃ; Manufacturer: Littelfuse; Quality: -40~125¡æ; pro-environment: RoHS; Value: 15V,400W; OPN: SM15-02HTG; other: Vc=24V;Vrwm=15V;AEC-Q101; PadsNum: 0; SN: SN; Part: SM15; Category: TVS¹Ü; QTY: 3000; Price: 1.3455; OPN_JLC: OPN_JLC; SN_JLC: SN_JLC; Price_JLC: 0
footprint SOT23-3 (SOT-23; 3 Leads; Body 3.0 x 2.5 mm, inc. leads (LxW max))
pins: 1, 2, 3

## TVS_SM712-02HTG
designator TVS?, comment SM712
TVS¹Ü; RS485×¨ÓÃ; Manufacturer: Littelfuse; Quality: -40~125¡æ; pro-environment: RoHS; Value: -7V~12V,600W; OPN: SM712-02HTG; PadsNum: 3; SN: SN; Part: SM712; Category: TVS¹Ü; QTY: 3000; Price: -; OPN_JLC: SM712-02HTG; SN_JLC: C2827658; Price_JLC: 0.488176
footprint SOT23-3 (SOT-23; 3 Leads; Body 3.0 x 2.5 mm, inc. leads (LxW max))
pins: 1, 2, 3

## TVS_SMA5J28CA
designator TVS?, comment SMA5J28CA
TVS, 28V Stand-off; Manufacturer: Vishay; Quality: -55~150°C; pro-environment: RoHS; Value: 31.1~34.4V,28V,500W; other: MARK=LZ; PadsNum: 0; OPN: SMA5J28CA; Part: SMA5J28CA; Category: TVS; QTY: 750; Price: ?; OPN_JLC: OPN_JLC; SN_JLC: SN_JLC; Price_JLC: 0
footprint DO-214AC (DO-214-AC/SMA)
pins: 1 "A", 2 "K"

## TVS_SMAJ54CA-TP
designator TVS?, comment SMAJ54CA
TVS¹Ü; Manufacturer: MCC; Quality: -55~150¡æ; pro-environment: RoHS; Value: 60~66.3V,87.1V,400W; OPN: SMAJ54CA-TP; other: MARK=ZE; PadsNum: 0; SN: SN; Part: SMAJ54CA; Category: TVS¹Ü; QTY: 5000; Price: 0.79891; OPN_JLC: OPN_JLC; SN_JLC: SN_JLC; Price_JLC: 0
footprint SMA (DO-214-AC/SMA)
pins: 1 "A", 2 "K"

## TVS_SMBJ3V3-E3/52
designator TVS?, comment SMBJ3V3
TVS¹Ü; Manufacturer: Vishay; Quality: -55~150¡æ; pro-environment: RoHS; Value: 4.1V,10.3V,600W; OPN: SMBJ3V3-E3/52; other: MARK=KC; PadsNum: 0; SN: SN; Part: SMBJ3V3; Category: TVS¹Ü; QTY: 750; Price: ?; OPN_JLC: OPN_JLC; SN_JLC: SN_JLC; Price_JLC: 0
footprint SMB (DO-214AA/SMB)
pins: 1 "A", 2 "K"

## TVS_SMBJ5.0A-E3/52
designator TVS?, comment SMBJ5.0A
TVS¹Ü; Manufacturer: Vishay; Quality: -55~150¡æ; pro-environment: RoHS; Value: 6.40~7.07V,9.6V,600W; SN: 03.4.21.24.99BJ5A02S; OPN: SMBJ5.0A-E3/52; other: MARK=KE; PadsNum: 0; Part: SMBJ5.0A; Category: TVS¹Ü; QTY: 750; Price: ?; OPN_JLC: OPN_JLC; SN_JLC: SN_JLC; Price_JLC: 0
footprint SMB (DO-214AA/SMB)
pins: 1 "A", 2 "K"

## TVS_SMBJ8.0AHE3/52
designator TVS?, comment SMBJ8.0A
TVS¹Ü; Manufacturer: Vishay; Quality: -55~150¡æ; pro-environment: RoHS; Value: 8.89~9.83V,13.6V,600W; OPN: SMBJ8.0AHE3/52; other: MARK=KR; PadsNum: 0; SN: SN; Part: SMBJ8.0A; Category: TVS¹Ü; QTY: 750; Price: 1.5795; OPN_JLC: OPN_JLC; SN_JLC: SN_JLC; Price_JLC: 0
footprint SMB (DO-214AA/SMB)
pins: 1 "A", 2 "K"

## TVS_SMBJ10CA-E3/52
designator TVS?, comment SMBJ10CA
TVS¹Ü; Manufacturer: Vishay; Quality: -55~150¡æ; pro-environment: RoHS; Value: 11.1~12.3V,17V,600W; OPN: SMBJ10CA-E3/52; other: MARK=AX; PadsNum: 0; SN: SN; Part: SMBJ10CA; Category: TVS¹Ü; QTY: 750; Price: 0.98631; OPN_JLC: OPN_JLC; SN_JLC: SN_JLC; Price_JLC: 0
footprint SMB (DO-214AA/SMB)
pins: 1 "A", 2 "K"

## TVS_SMBJ15AHE3/52
designator TVS?, comment SMBJ15A
TVS¹Ü; Manufacturer: Vishay; Quality: -55~150¡æ; pro-environment: RoHS; Value: 16.7~18.5V,24.4V,600W; SN: 03.4.21.24.99J15A01S; OPN: SMBJ15AHE3/52; other: MARK=LM; PadsNum: 0; Part: SMBJ15A; Category: TVS¹Ü; QTY: 750; Price: ?; OPN_JLC: OPN_JLC; SN_JLC: SN_JLC; Price_JLC: 0
footprint SMB (DO-214AA/SMB)
pins: 1 "A", 2 "K"

## TVS_SMBJ18A-E3/52
designator TVS?, comment SMBJ18A
TVS¹Ü; Manufacturer: Vishay; Quality: -55~150¡æ; pro-environment: RoHS; Value: 20.0~22.1V,29.2V,600W; OPN: SMBJ18A-E3/52; other: MARK=LT; PadsNum: 0; SN: SN; Part: SMBJ18A; Category: TVS¹Ü; QTY: 750; Price: 0.88101; OPN_JLC: OPN_JLC; SN_JLC: SN_JLC; Price_JLC: 0
footprint SMB (DO-214AA/SMB)
pins: 1 "A", 2 "K"

## TVS_SMBJ18CA-E3/52
designator TVS?, comment SMBJ18CA
TVS¹Ü; Manufacturer: Vishay; Quality: -55~150¡æ; pro-environment: RoHS; Value: 20.0~22.1V,32.2V,600W; SN: 03.4.21.24.99J18A01S; OPN: SMBJ18CA-E3/52; other: MARK=BT; PadsNum: 0; Part: SMBJ18CA; Category: TVS¹Ü; QTY: 750; Price: 0.98631; OPN_JLC: OPN_JLC; SN_JLC: SN_JLC; Price_JLC: 0
footprint SMB (DO-214AA/SMB)
pins: 1 "A", 2 "K"

## TVS_SMBJ24AHE3/52
designator TVS?, comment SMBJ24A
TVS¹Ü; Manufacturer: Vishay; Quality: -55~150¡æ; pro-environment: RoHS; Value: 26.7~29.5V,38.9V,600W; SN: 03.4.21.24.99J24A01S; OPN: SMBJ24AHE3/52; other: MARK=LZ; PadsNum: 0; Part: SMBJ24A; Category: TVS¹Ü; QTY: 750; Price: ?; OPN_JLC: OPN_JLC; SN_JLC: SN_JLC; Price_JLC: 0
footprint SMB (DO-214AA/SMB)
pins: 1 "A", 2 "K"

## TVS_SMBJ30A-E3/52
designator TVS?, comment SMBJ30A
TVS¹Ü; Manufacturer: Vishay; Quality: -55~150¡æ; pro-environment: RoHS; Value: 33.3~36.8V,48.4V,600W; SN: 03.4.21.24.99J30A01S; OPN: SMBJ30A-E3/52; other: MARK=MK; PadsNum: 0; Part: SMBJ30A; Category: TVS¹Ü; QTY: 750; Price: ?; OPN_JLC: OPN_JLC; SN_JLC: SN_JLC; Price_JLC: 0
footprint SMB (DO-214AA/SMB)
pins: 1 "A", 2 "K"

## TVS_SMBJ33A-E3/52
designator TVS?, comment SMBJ33A
TVS¹Ü; Manufacturer: Vishay; Quality: -55~150¡æ; pro-environment: RoHS; Value: 36.7~40.6V,53.3V,600W; SN: 03.4.21.24.99J33A02S; OPN: SMBJ33A-E3/52; other: MARK=MM; PadsNum: 0; Part: SMBJ33A; Category: TVS¹Ü; QTY: 750; Price: ?; OPN_JLC: OPN_JLC; SN_JLC: SN_JLC; Price_JLC: 0
footprint SMB (DO-214AA/SMB)
pins: 1 "A", 2 "K"

## TVS_SMBJ33CA-E3/52
designator TVS?, comment SMBJ33CA
TVS¹Ü; Manufacturer: Vishay; Quality: -55~150¡æ; pro-environment: RoHS; Value: 36.7~40.6V,53.3V,600W; SN: 03.4.21.24.99J33C01S; OPN: SMBJ33CA-E3/52; other: MARK=CM; PadsNum: 0; Part: SMBJ33CA; Category: TVS¹Ü; QTY: 750; Price: 0.93951; OPN_JLC: OPN_JLC; SN_JLC: SN_JLC; Price_JLC: 0
footprint SMB (DO-214AA/SMB)
pins: 1 "A", 2 "K"

## TVS_SMBJ36A-E3/52
designator TVS?, comment SMBJ36A
TVS¹Ü; Manufacturer: Vishay; Quality: -55~150¡æ; pro-environment: RoHS; Value: 40~44.2V,58.1V,600W; SN: 03.4.21.24.99J36A01S; OPN: SMBJ36A-E3/52; other: MARK=MM; PadsNum: 0; Part: SMBJ36A; Category: TVS¹Ü; QTY: 750; Price: ?; OPN_JLC: OPN_JLC; SN_JLC: SN_JLC; Price_JLC: 0
footprint SMB (DO-214AA/SMB)
pins: 1 "A", 2 "K"

## TVS_SMBJ45AHE3/52
designator TVS?, comment SMBJ45A
TVS¹Ü; Manufacturer: Vishay; Quality: -55~150¡æ; pro-environment: RoHS; Value: 50~55.3V,45V,600W; OPN: SMBJ45AHE3/52; other: MARK=MV; PadsNum: 0; SN: SN; Part: SMBJ45A; Category: TVS¹Ü; QTY: 750; Price: ?; OPN_JLC: OPN_JLC; SN_JLC: SN_JLC; Price_JLC: 0
footprint SMB (DO-214AA/SMB)
pins: 1 "A", 2 "K"

## TVS_SMBJ48AHE3/52
designator TVS?, comment SMBJ48A
TVS¹Ü; Manufacturer: Vishay; Quality: -55~150¡æ; pro-environment: RoHS; Value: 53.3~58.9V,48V,600W; OPN: SMBJ48AHE3/52; other: MARK=MA; PadsNum: 0; SN: SN; Part: SMBJ48A; Category: TVS¹Ü; QTY: 750; Price: ?; OPN_JLC: OPN_JLC; SN_JLC: SN_JLC; Price_JLC: 0
footprint SMB (DO-214AA/SMB)
pins: 1 "A", 2 "K"

## TVS_SMBJ150CA-E3/52
designator TVS?, comment SMBJ150CA
TVS¹Ü; Manufacturer: Vishay; Quality: -55~150¡æ; pro-environment: RoHS; Value: 167~185V,240V,600W; OPN: SMBJ150CA-E3/52; other: MARK=KE; PadsNum: 0; SN: SN; Part: SMBJ150CA; Category: TVS¹Ü; QTY: 750; Price: ?; OPN_JLC: OPN_JLC; SN_JLC: SN_JLC; Price_JLC: 0
footprint SMB (DO-214AA/SMB)
pins: 1 "A", 2 "K"

## TVS_SMBJ350CA
designator TVS?, comment SMBJ350CA
TVS¹Ü; Manufacturer: Littelfuse; Quality: -65~150¡æ; pro-environment: RoHS; Value: 391~576V,350V,800W; other: MARK=KE; PadsNum: 2; SN: SN; OPN: SMBJ350CA; Part: SMBJ350CA; Category: TVS¹Ü; QTY: 3000; Price: ?; OPN_JLC: SMBJ350CA; SN_JLC: C309960; Price_JLC: 0.607545
footprint SMB (DO-214AA/SMB)
pins: 1 "A", 2 "K"

## TVS_TPD2E001DZDR
designator TVS?, comment TPD2E001
TVS¹Ü;; Manufacturer: TI; Quality: -40~125¡æ; pro-environment: RoHS; Value: 5V~11V; OPN: TPD2E001DZDR; PadsNum: 0; SN: SN; Part: TPD2E001; Category: TVS¹Ü; QTY: 3000; Price: 1.4238; OPN_JLC: OPN_JLC; SN_JLC: SN_JLC; Price_JLC: 0
footprint SOT143-4 (SOT143, 4-Leads, Body 2.9x1.3mm, Pitch 1.9mm, Lead Span 2.4mm, IPC Low Density)
pins: 1 GND (power), 2 IO1, 3 IO2, 4 VCC (power)
text: TVS

## TVS_USBLC6-2SC6
designator TVS?, comment USBLC6-2SC6
TVS¹Ü;; Manufacturer: ST; Quality: -40~125¡æ; pro-environment: RoHS; Value: 5.25V~17V; PadsNum: 6; SN: SN; OPN: USBLC6-2SC6; Part: USBLC6-2SC6; Category: TVS¹Ü; QTY: 3000; Price: 0.552987; OPN_JLC: USBLC6-2SC6; SN_JLC: C7519; Price_JLC: 0.552987
footprint SOT23-6 (SOT23, 6-Leads, Body 2.9x1.6mm, Pitch 0.95mm, Lead Span 2.7mm, IPC Low Density)
pins: 1 IO1, 2 GND (power), 3 IO2, 4 IO2, 5 VCC (power), 6 IO1
text: TVS

## U_A2415S-2WR2
designator U?, comment 24V->¡À15V/67mA
DC/DC;Vin=21.6~26.4V;Vout=¡À15V/67mA; Manufacturer: MORNSUN; Quality: -40~85¡æ; pro-environment: RoHS; OPN: A2415S-2WR2; PadsNum: 0; Value: ¡À15V/67mA; SN: SN; other: Vin=21.6~26.4V;Vout=¡À15V/67mA; Category: Ä£¿éµçÂ·; Part: 24V->¡À15V/67mA; QTY: 1; Price: ?; OPN_JLC: OPN_JLC; SN_JLC: SN_JLC; Price_JLC: 0
footprint U_AS-2WR2 (DC/DC, A_S-2WR2¡¢B_S-2WR2ÏµÁÐ, MORNSUN)
pins: 1 Vin+ (power), 2 Vin- (power), 4 Vout- (power), 5 0V (power), 6 Vout+ (power)

## U_ESP-01S
designator U?, comment ESP8266
UART<->WiFi;15*25;Male-8; Manufacturer: Ai-Thinker; Quality: -40~85¡æ; pro-environment: RoHS; other: Vin=45V~160V;Vout=24V/1.6A; PadsNum: 0; Value: UART<->WiFi; SN: SN; Category: Ä£¿éµçÂ·; OPN: ESP8266; Part: ESP8266; QTY: 1; Price: -; OPN_JLC: ESP-01S; SN_JLC: C503582; Price_JLC: 9.88
footprint U_ESP-01S (°²ÐÅ¿ÉWiFiÄ£¿éESP-01 & ESP-01SÏµÁÐ)
pins: 1 GND (power), 2 IO2 (io), 3 IO0 (io), 4 RX (in), 5 TX (out), 6 EN (in), 7 ~{RST} (in), 8 VDD (power)

## U_ESP-12F
designator U?, comment ESP-12F
UART<->WiFi; 3.3V/0.5A; 24*16*3mm; °åÔØÌìÏß;; Manufacturer: Ai-Thinker; Quality: -40~85¡æ; pro-environment: RoHS; other: 3.0~3.6V, 0.5A, °åÔØÌìÏß; OPN: ESP8266; PadsNum: 22; Value: UART<->WiFi; SN: SN; Category: Ä£¿éµçÂ·; Part: ESP-12F; QTY: 1; Price: ?; OPN_JLC: ESP-12F; SN_JLC: C82891; Price_JLC: 8.68
footprint U_ESP-12F (°²ÐÅ¿ÉESP8266ÏµÁÐÖ®ESP-12F»òESP-12E)
pins: 1 RST, 2 ADC, 3 EN, 4 GPIO16, 5 SCK, 6 MISO, 7 MOSI, 8 VCC, 15 GND, 16 GPIO15, 17 GPIO2, 18 GPIO0, 19 GPIO4, 20 GPIO5, 21 RXD0 (in), 22 TXD0 (out)